# Altium footprint library Components.PcbLib: 127 footprints (part 3 of 8)
Each footprint in its own frame and in the unit in brackets; x right, y up, seen from the top. Pads: shape width x height; smd on the part's side, far side on the other; paste and mask are expansions set on the pad; w line width, h text height; cw(c..) or ccw(c..) is an arc to the next point about the centre after c.
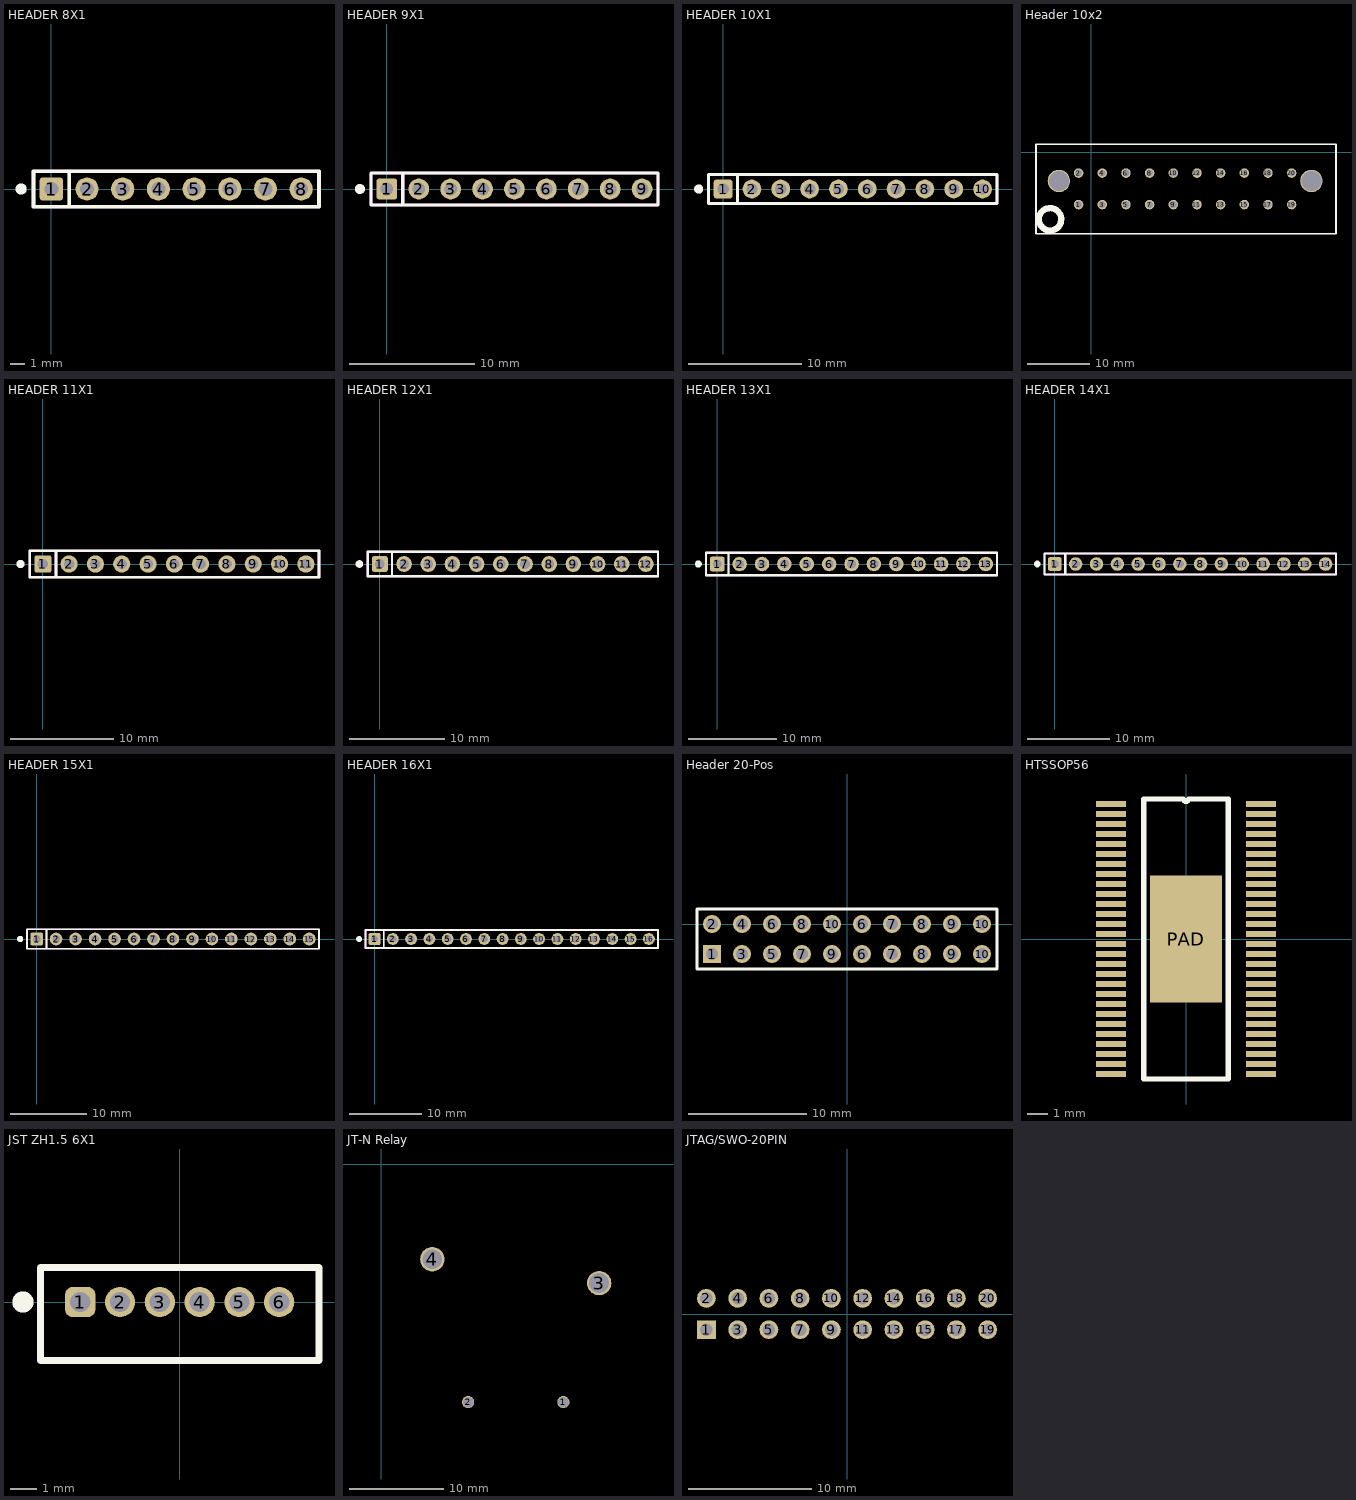
[diagram p2: the footprints below, top view; thin cyan lines are the x and y axes]

## HEADER 8X1 [mil] "PinHeader 1x8 TH Pitch 2.54mm"
height 374.02
pads (8):
  rrect25% 65x65 hole 39.37: 1(0,0)
  round 65 hole 39.37: 2(100,0) 3(200,0) 4(300,0) 5(400,0) 6(500,0) 7(600,0) 8(700,0)
Top Overlay:
  circle w19.68: c-84.65,0 r5.91
  lines w10: 50,-50 50,50 -50,50 ; -50,50 750,50 750,-50 -50,-50 -50,50
Mechanical 3:
  lines w10: 50,-50 50,50 -50,50 ; -50,50 750,50 750,-50 -50,-50 -50,50
3D body "Pin Header 1x8 TH Pitch 2.54mm.stp": height 373.85, standoff -125.98, extent -50,-50 750,50

## HEADER 9X1 [mil] "PinHeader 1x9 TH Pitch 2.54mm"
height 374.02
pads (9):
  rrect25% 65x65 hole 39.37: 1(0,0)
  round 65 hole 39.37: 2(100,0) 3(200,0) 4(300,0) 5(400,0) 6(500,0) 7(600,0) 8(700,0) 9(800,0)
Top Overlay:
  circle w19.68: c-84.65,0 r5.91
  lines w10: 50,-50 50,50 -50,50 ; -50,50 -50,-50 850,-50 850,50 -50,50
Mechanical 3:
  lines w10: 50,-50 50,50 -50,50 ; -50,50 -50,-50 850,-50 850,50 -50,50
3D body "Pin Header 1x9 TH Pitch 2.54mm.stp": height 373.85, standoff -125.98, extent -50,-50 850,50

## HEADER 10X1 [mil] "PinHeader 1x10 TH Pitch 2.54mm"
height 374.02
pads (10):
  rrect25% 65x65 hole 39.37: 1(0,0)
  round 65 hole 39.37: 2(100,0) 3(200,0) 4(300,0) 5(400,0) 6(500,0) 7(600,0) 8(700,0) 9(800,0) 10(900,0)
Top Overlay:
  circle w19.68: c-84.65,0 r5.91
  lines w10: 50,-50 50,50 -50,50 ; -50,50 950,50 950,-50 -50,-50 -50,50
Mechanical 3:
  lines w10: 50,-50 50,50 -50,50 ; -50,50 950,50 950,-50 -50,-50 -50,50
3D body "Pin Header 1x10 TH Pitch 2.54mm.stp": height 373.85, standoff -125.98, extent -50,-50 950,50

## Header 10x2 [mil]
pads (22):
  round 60 hole 45.28: 1(-81,-333) 2(-81,-133) 5(219,-333) 6(219,-133) 9(519,-333) 10(519,-133) 13(819,-333) 14(819,-133) 17(1119,-333) 18(1119,-133)
  round 60 hole 40: 3(69,-333) 4(69,-133) 7(369,-333) 8(369,-133) 11(669,-333) 12(669,-133) 15(969,-333) 16(969,-133) 19(1269,-333) 20(1269,-133)
  round 141.73 hole 125.98: ""(-206,-183) ""(1394,-183)
Top Overlay:
  lines w10: 348,50 -351,50 -351,-518 1550,-518 1550,50 350,50
  lines w39.37: -191.01,-427.25 cw(c-261.87,-426) -191,-426

## HEADER 11X1 [mil] "PinHeader 1x11 TH Pitch 2.54mm"
height 374.02
pads (11):
  rrect25% 65x65 hole 39.37: 1(0,0)
  round 65 hole 39.37: 2(100,0) 3(200,0) 4(300,0) 5(400,0) 6(500,0) 7(600,0) 8(700,0) 9(800,0) 10(900,0) 11(1000,0)
Top Overlay:
  circle w19.68: c-84.65,0 r5.91
  lines w10: 50,-50 50,50 -50,50 ; -50,50 -50,-50 1050,-50 1050,50 -50,50
Mechanical 3:
  lines w10: 50,-50 50,50 -50,50 ; -50,50 -50,-50 1050,-50 1050,50 -50,50
3D body "Pin Header 1x11 TH Pitch 2.54mm.stp": height 373.85, standoff -125.98, extent -50,-50 1050,50

## HEADER 12X1 [mil] "PinHeader 1x12 TH Pitch 2.54mm"
height 374.02
pads (12):
  rrect25% 65x65 hole 39.37: 1(0,0)
  round 65 hole 39.37: 2(100,0) 3(200,0) 4(300,0) 5(400,0) 6(500,0) 7(600,0) 8(700,0) 9(800,0) 10(900,0) 11(1000,0) 12(1100,0)
Top Overlay:
  circle w19.68: c-84.65,0 r5.91
  lines w10: 50,-50 50,50 -50,50 ; -50,50 -50,-50 1150,-50 1150,50 -50,50
Mechanical 3:
  lines w10: 50,-50 50,50 -50,50 ; -50,50 -50,-50 1150,-50 1150,50 -50,50
3D body "Pin Header 1x12 TH Pitch 2.54mm.stp": height 373.85, standoff -125.98, extent -50,-50 1150,50

## HEADER 13X1 [mil] "PinHeader 1x13 TH Pitch 2.54mm"
height 374.02
pads (13):
  rrect25% 65x65 hole 39.37: 1(0,0)
  round 65 hole 39.37: 2(100,0) 3(200,0) 4(300,0) 5(400,0) 6(500,0) 7(600,0) 8(700,0) 9(800,0) 10(900,0) 11(1000,0) 12(1100,0) 13(1200,0)
Top Overlay:
  circle w19.68: c-84.65,0 r5.91
  lines w10: 50,-50 50,50 -50,50 ; -50,50 -50,-50 1250,-50 1250,50 -50,50
Mechanical 3:
  lines w10: 50,-50 50,50 -50,50 ; -50,50 -50,-50 1250,-50 1250,50 -50,50
3D body "Pin Header 1x13 TH Pitch 2.54mm.stp": height 373.85, standoff -125.98, extent -50,-50 1250,50

## HEADER 14X1 [mil] "PinHeader 1x14 TH Pitch 2.54mm"
height 374.02
pads (14):
  rrect25% 65x65 hole 39.37: 1(0,0)
  round 65 hole 39.37: 2(100,0) 3(200,0) 4(300,0) 5(400,0) 6(500,0) 7(600,0) 8(700,0) 9(800,0) 10(900,0) 11(1000,0) 12(1100,0) 13(1200,0) 14(1300,0)
Top Overlay:
  circle w19.68: c-84.65,0 r5.91
  lines w10: 50,-50 50,50 -50,50 ; -50,50 -50,-50 1350,-50 1350,50 -50,50
Mechanical 3:
  lines w10: 50,-50 50,50 -50,50 ; -50,50 -50,-50 1350,-50 1350,50 -50,50
3D body "Pin Header 1x14 TH Pitch 2.54mm.stp": height 373.85, standoff -125.98, extent -50,-50 1350,50

## HEADER 15X1 [mil] "PinHeader 1x15 TH Pitch 2.54mm"
height 374.02
pads (15):
  rrect25% 65x65 hole 39.37: 1(0,0)
  round 65 hole 39.37: 2(100,0) 3(200,0) 4(300,0) 5(400,0) 6(500,0) 7(600,0) 8(700,0) 9(800,0) 10(900,0) 11(1000,0) 12(1100,0) 13(1200,0) 14(1300,0) 15(1400,0)
Top Overlay:
  circle w19.68: c-84.65,0 r5.91
  lines w10: 50,-50 50,50 -50,50 ; -50,50 1450,50 1450,-50 -50,-50 -50,50
Mechanical 3:
  lines w10: 50,-50 50,50 -50,50 ; -50,50 1450,50 1450,-50 -50,-50 -50,50
3D body "Pin Header 1x15 TH Pitch 2.54mm.stp": height 373.85, standoff -125.98, extent -50,-50 1450,50

## HEADER 16X1 [mil] "PinHeader 1x16 TH Pitch 2.54mm"
height 374.02
pads (16):
  rrect25% 65x65 hole 39.37: 1(0,0)
  round 65 hole 39.37: 2(100,0) 3(200,0) 4(300,0) 5(400,0) 6(500,0) 7(600,0) 8(700,0) 9(800,0) 10(900,0) 11(1000,0) 12(1100,0) 13(1200,0) 14(1300,0) 15(1400,0) 16(1500,0)
Top Overlay:
  circle w19.68: c-84.65,0 r5.91
  lines w10: 50,-50 50,50 -50,50 ; -50,50 -50,-50 1550,-50 1550,50 -50,50
Mechanical 3:
  lines w10: 50,-50 50,50 -50,50 ; -50,50 -50,-50 1550,-50 1550,50 -50,50
3D body "Pin Header 1x16 TH Pitch 2.54mm.stp": height 373.85, standoff -125.98, extent -50,-50 1550,50

## Header 20-Pos [mil]
pads (20):
  rect 60x60 hole 40: 1(-450,-100)
  round 60 hole 40: 2(-450,0) 3(-350,-100) 4(-350,0) 5(-250,-100) 6(-250,0) 6(50,-100) 6(50,0) 7(-150,-100) 7(150,-100) 7(150,0) 8(-150,0) 8(250,-100) 8(250,0) 9(-50,-100) 9(350,-100) 9(350,0) 10(-50,0) 10(450,-100) 10(450,0)
Top Overlay:
  lines w10: -500,-150 500,-150 500,50 -500,50 -500,-150

## HEATSINK TO220 [mm]
height 12.7
via 0,13.335 diameter 4.318 hole 3.81
3D body "TO-220 heatsink with screw.step": height 13.04, standoff -3.61, extent -6.502,0.05 6.498,19.05

## HTSSOP56 [mm]
pads (57):
  rect 1.5x0.3 smd: 1(-3.75,6.75) 2(-3.75,6.25) 3(-3.75,5.75) 4(-3.75,5.25) 5(-3.75,4.75) 6(-3.75,4.25) 7(-3.75,3.75) 8(-3.75,3.25) 9(-3.75,2.75) 10(-3.75,2.25) 11(-3.75,1.75) 12(-3.75,1.25) 13(-3.75,0.75) 14(-3.75,0.25) 15(-3.75,-0.25) 16(-3.75,-0.75) 17(-3.75,-1.25) 18(-3.75,-1.75) 19(-3.75,-2.25) 20(-3.75,-2.75) 21(-3.75,-3.25) 22(-3.75,-3.75) 23(-3.75,-4.25) 24(-3.75,-4.75) 25(-3.75,-5.25) 26(-3.75,-5.75) 27(-3.75,-6.25) 28(-3.75,-6.75) 29(3.75,-6.75) 30(3.75,-6.25) 31(3.75,-5.75) 32(3.75,-5.25) 33(3.75,-4.75) 34(3.75,-4.25) 35(3.75,-3.75) 36(3.75,-3.25) 37(3.75,-2.75) 38(3.75,-2.25) 39(3.75,-1.75) 40(3.75,-1.25) 41(3.75,-0.75) 42(3.75,-0.25) 43(3.75,0.25) 44(3.75,0.75) 45(3.75,1.25) 46(3.75,1.75) 47(3.75,2.25) 48(3.75,2.75) 49(3.75,3.25) 50(3.75,3.75) 51(3.75,4.25) 52(3.75,4.75) 53(3.75,5.25) 54(3.75,5.75) 55(3.75,6.25) 56(3.75,6.75)
  rect 3.61x6.35 smd: PAD(0,0)
Top Overlay:
  lines w0.254: -2.111,-7 -2.111,7 -0.125,7 ccw(c0,7) 0.125,7 2.111,7 2.111,-7 -2.111,-7
3D body "TSSOP-56.stp": height 1.11, standoff 0.01, extent -4.065,-7.035 4.065,7.036

## JST ZH1.5 6X1 [mil]
pads (6):
  rrect50% 45x45 hole 30: 1(-147.64,0)
  round 45 hole 30: 2(-88.58,0) 3(-29.53,0) 4(29.53,0) 5(88.58,0) 6(147.64,0)
Top Overlay:
  circle w19.68: c-232.64,0 r5.91
  lines w10: -206.69,-86.61 206.69,-86.61 206.69,51.18 -206.69,51.18 -206.69,0 -206.69,-86.61
3D body "B6B-ZR.STEP": height 177.17, standoff -106.3, extent -206.69,-86 206.69,51.8

## JT-N Relay [mm]
height 21
pads (4):
  round 1.3 hole 1.1: 1(19.406,-25.4) 2(9.246,-25.4)
  round 2.6 hole 2.1: 3(23.216,-12.7) 4(5.436,-10.16)
Bottom Overlay:
  lines w0.254: 0.762,-12.7 5.461,-12.7 5.461,-31.242 ; 25.146,-31.242 25.146,-17.526 26.238,-17.526 ; 0,-32.004 0,0 27,0 27,-32.004 0,-32.004
3D body "relay30A4.step": height 1.4, standoff -21.6, extent 0.026,-32 27.026,0

## JTAG/SWO-20PIN [mil]
pads (20):
  rect 60x60 hole 40: 1(-450,-50)
  round 60 hole 40: 2(-450,50) 3(-350,-50) 4(-350,50) 5(-250,-50) 6(-250,50) 7(-150,-50) 8(-150,50) 9(-50,-50) 10(-50,50) 11(50,-50) 12(50,50) 13(150,-50) 14(150,50) 15(250,-50) 16(250,50) 17(350,-50) 18(350,50) 19(450,-50) 20(450,50)
3D body "Pin Header 2x10 TH Pitch 2.54mm.stp": height 373.85, standoff -125.98, extent -500,-100 500,100